# Altium footprint library esp32.PcbLib: 4 footprints
Each footprint in its own frame and in the unit in brackets; x right, y up, seen from the top. Pads: shape width x height; smd on the part's side, far side on the other; paste and mask are expansions set on the pad; w line width, h text height; cw(c..) or ccw(c..) is an arc to the next point about the centre after c.
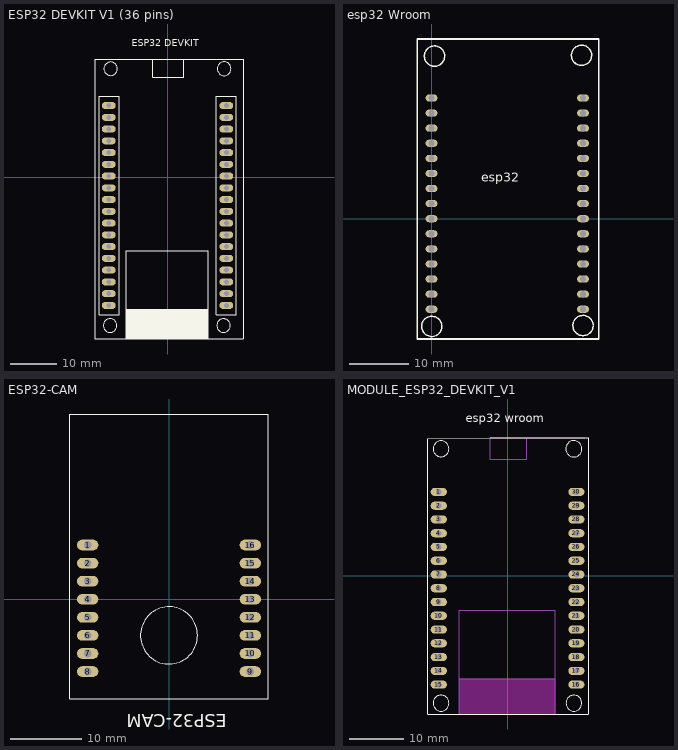
[diagram p0: the footprints below, top view; thin cyan lines are the x and y axes]

## ESP32 DEVKIT V1 (36 pins) [mm]
height 6.8
pads (36):
  oval 3x1.5 hole 1.07: 1(-12.7,15.515) 2(-12.7,12.975) 3(-12.7,10.435) 4(-12.7,7.895) 5(-12.7,5.355) 6(-12.7,2.815) 7(-12.7,0.275) 8(-12.7,-2.265) 9(-12.7,-4.805) 10(-12.7,-7.345) 11(-12.7,-9.885) 12(-12.7,-12.425) 13(-12.7,-14.965) 14(-12.7,-17.505) 15(-12.7,-20.045) 16(-12.7,-22.585) 17(-12.7,-25.125) 18(-12.7,-27.665) 19(12.7,-27.665) 20(12.7,-25.125) 21(12.7,-22.585) 22(12.7,-20.045) 23(12.7,-17.505) 24(12.7,-14.965) 25(12.7,-12.425) 26(12.7,-9.885) 27(12.7,-7.345) 28(12.7,-4.805) 29(12.7,-2.265) 30(12.7,0.275) 31(12.7,2.815) 32(12.7,5.355) 33(12.7,7.895) 34(12.7,10.435) 35(12.7,12.975) 36(12.7,15.515)
Top Overlay:
  circle w0.15: c-12.407,-32.015 r1.464
  circle w0.15: c12.103,-32.015 r1.464
  circle w0.15: c12.23,23.475 r1.496
  circle w0.15: c-12.28,23.475 r1.464
  rectangle: -8.91,-34.904 8.78,-28.414
  lines w0.127: -8.91,-34.904 -8.91,-15.804 8.78,-15.804 8.78,-34.904 ; -3.211,25.475 -3.211,21.625 3.5,21.625 3.5,25.475 ; -3.211,25.475 3.5,25.475 ; -3.211,25.475 -15.748,25.475 -15.748,-34.925 -8.91,-34.925 8.78,-34.925 16.383,-34.925 16.383,25.475 3.5,25.475 ; -14.732,-29.718 -14.732,17.526 -10.414,17.526 -10.414,-29.718 -14.732,-29.718 ; 10.541,-29.718 10.541,17.526 14.859,17.526 14.859,-29.718 10.541,-29.718
  text "ESP32 DEVKIT" at -7.75,28.375 h1.52
3D body "18-Pin Header - Female - 2.54mm.step": height 5, standoff -3, extent 11.5,-29.16 14,17.06
3D body "18-Pin Header - Female - 2.54mm.step": height 5, standoff -3, extent -13.95,-29.16 -11.45,17.06

## esp32 Wroom [mm]
pads (30):
  oval 2x1.2 hole 1.07: 1(0,20.32) 2(0,17.78) 3(0,15.24) 4(0,12.7) 5(0,10.16) 6(0,7.62) 7(0,5.08) 8(0,2.54) 9(0,0) 10(0,-2.54) 11(0,-5.08) 12(0,-7.62) 13(0,-10.16) 14(0,-12.7) 15(0,-15.24) 16(25.5,-15.24) 17(25.5,-12.7) 18(25.5,-10.16) 19(25.5,-7.62) 20(25.5,-5.08) 21(25.5,-2.54) 22(25.5,0) 23(25.5,2.54) 24(25.5,5.08) 25(25.5,7.62) 26(25.5,10.16) 27(25.5,12.7) 28(25.5,15.24) 29(25.5,17.78) 30(25.5,20.32)
Top Overlay:
  lines w0.254: 1.742,-18.227 cw(c0.038,-18.128) 1.744,-18.11 ; 2.204,27.276 cw(c0.5,27.375) 2.206,27.393 ; 26.954,27.401 cw(c25.25,27.5) 26.956,27.518 ; 27.204,-18.081 cw(c25.5,-17.982) 27.206,-17.964 ; -2.375,-20.25 28.125,-20.25 28.125,30.25 -2.375,30.25 -2.375,-20.25
  text "esp32" at 8.375,6.25 h1.52

## ESP32-CAM [mm]
pads (16):
  oval 3x1.5 hole 1.07: 1(-11.43,7.62) 2(-11.43,5.08) 3(-11.43,2.54) 4(-11.43,0) 5(-11.43,-2.54) 6(-11.43,-5.08) 7(-11.43,-7.62) 8(-11.43,-10.16) 9(11.43,-10.16) 10(11.43,-7.62) 11(11.43,-5.08) 12(11.43,-2.54) 13(11.43,0) 14(11.43,2.54) 15(11.43,5.08) 16(11.43,7.62)
Top Overlay:
  circle w0.127: c0,-5.08 r4.016
  lines w0.127: -13.97,-13.97 -13.97,26.035 13.97,26.035 13.97,-13.97 -13.97,-13.97
  text "ESP32-CAM" at 8.125,-16.125 h1.78
3D body "esp32 cam dev avec barette.x_t": height 16.1, standoff -3.04, extent -13.5,-14.625 13.5,25.375

## MODULE_ESP32_DEVKIT_V1 [mm]
height 6.8
pads (30):
  oval 3x1.5 hole 1.07: 1(-12.7,15.515) 2(-12.7,12.975) 3(-12.7,10.435) 4(-12.7,7.895) 5(-12.7,5.355) 6(-12.7,2.815) 7(-12.7,0.275) 8(-12.7,-2.265) 9(-12.7,-4.805) 10(-12.7,-7.345) 11(-12.7,-9.885) 12(-12.7,-12.425) 13(-12.7,-14.965) 14(-12.7,-17.505) 15(-12.7,-20.045) 16(12.7,-20.045) 17(12.7,-17.505) 18(12.7,-14.965) 19(12.7,-12.425) 20(12.7,-9.885) 21(12.7,-7.345) 22(12.7,-4.805) 23(12.7,-2.265) 24(12.7,0.275) 25(12.7,2.815) 26(12.7,5.355) 27(12.7,7.895) 28(12.7,10.435) 29(12.7,12.975) 30(12.7,15.515)
Top Overlay:
  circle w0.15: c-12.28,-23.475 r1.464
  circle w0.15: c12.23,-23.475 r1.464
  circle w0.15: c12.23,23.475 r1.496
  circle w0.15: c-12.28,23.475 r1.464
  lines w0.127: -14.728,-25.475 -8.91,-25.475 8.78,-25.475 14.875,-25.475 14.875,25.475 3.5,25.475 -3.211,25.475 -14.728,25.375 -14.728,-25.475
  text "esp32 wroom" at -7.75,28.375 h1.52
Keep-Out Layer:
  region: 8.78,-25.475 -8.91,-25.475 -8.91,-18.985 8.78,-18.985
  region: 8.78,-25.475 -8.91,-25.475 -8.91,-18.985 8.78,-18.985
Mechanical 13:
  lines w0.127: -8.91,-25.475 -8.91,-18.985 ; 8.78,-25.475 8.78,-18.985 ; 14.23,25.475 3.5,25.475 ; -8.91,-18.985 -8.91,-6.355 8.78,-6.355 8.78,-18.985 ; -8.91,-18.985 8.78,-18.985 ; 3.5,25.475 -3.211,25.475 -3.211,21.585 3.5,21.585 3.5,25.475
3D body "esp32 dev avec barette.x_t": height 12.6, standoff -2.45, extent -14.072,-25.975 14.128,26.475